# Altium footprint library PCBLIB.PcbLib: 775 footprints (part 42 of 49)
Each footprint in its own frame and in the unit in brackets; x right, y up, seen from the top. Pads: shape width x height; smd on the part's side, far side on the other; paste and mask are expansions set on the pad; w line width, h text height; cw(c..) or ccw(c..) is an arc to the next point about the centre after c.
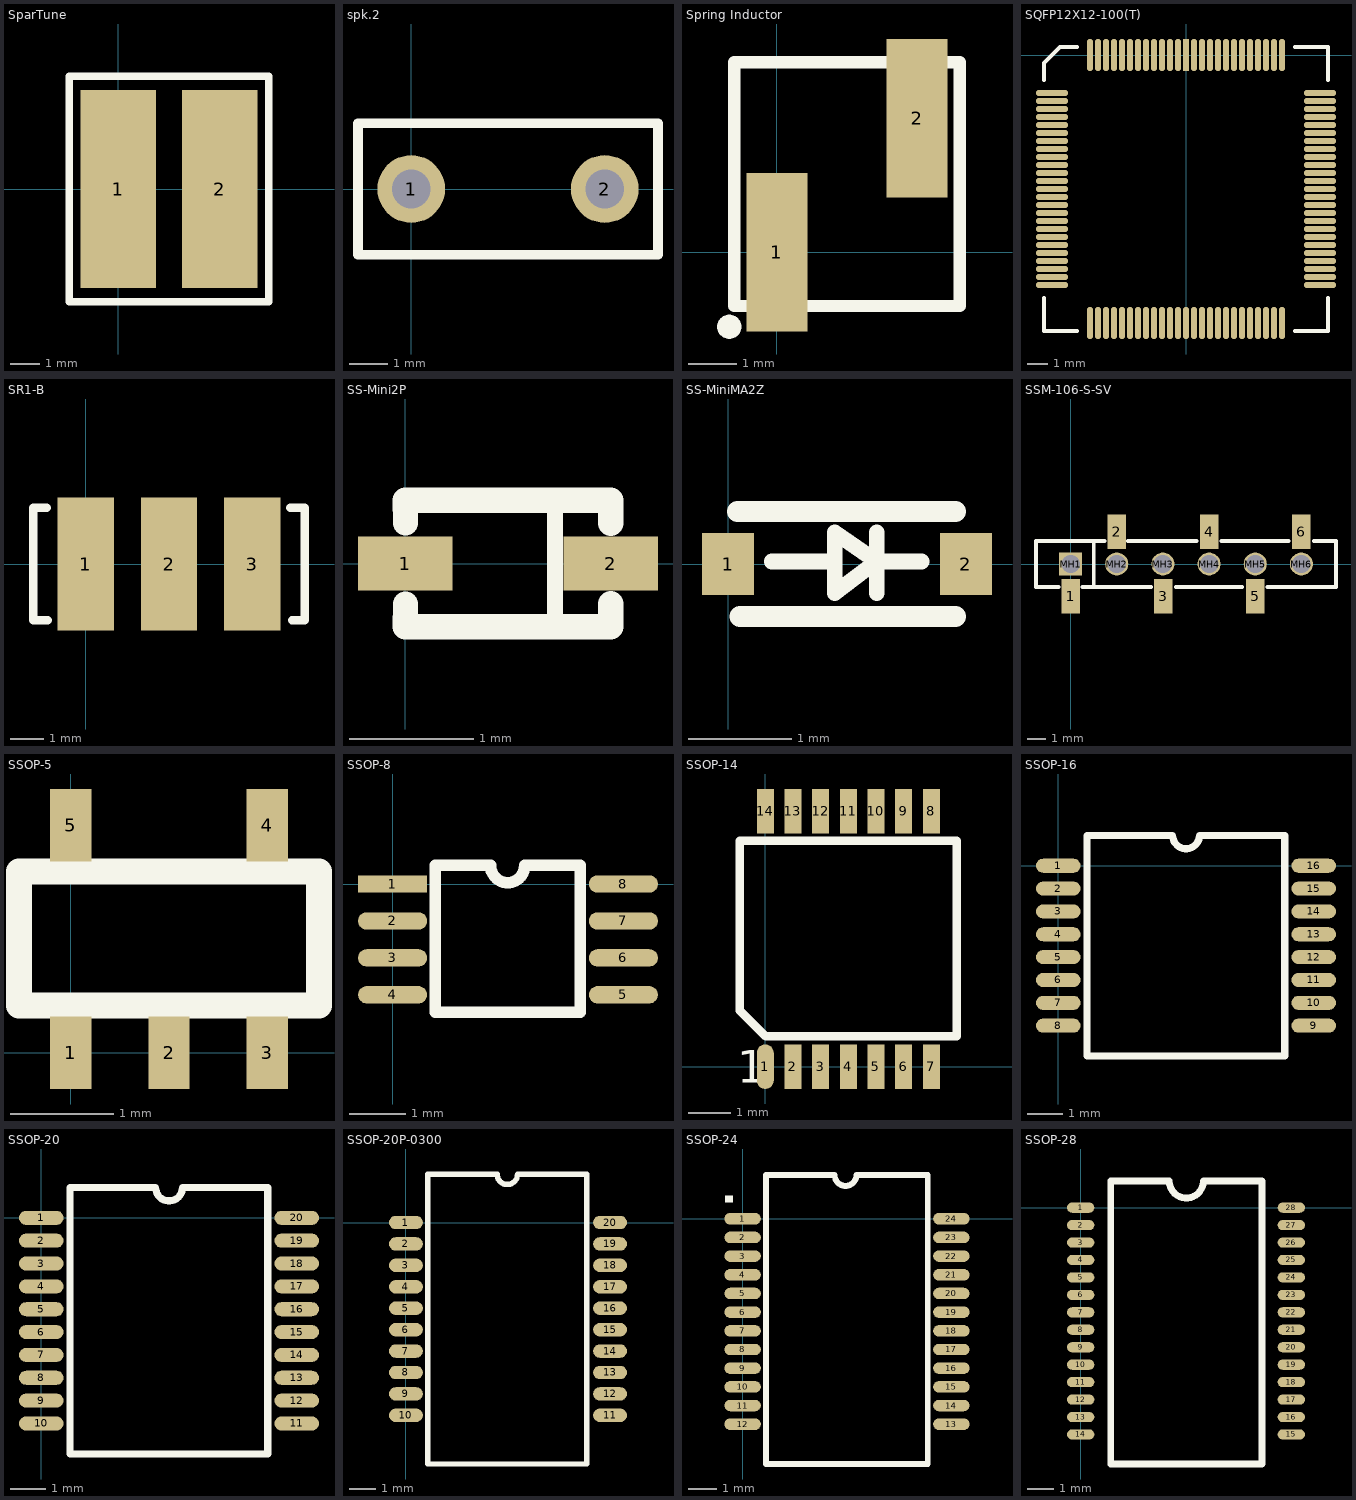
[diagram p41: the footprints below, top view; thin cyan lines are the x and y axes]

## SparTune [mil]
height 40
pads (2):
  rect 100x264 smd: 1(0,0) 2(135,0)
TopOverlay:
  lines w10: -65,-150 200,-150 200,150 -65,150 -65,-150
Mechanical4:
  text ".110" at 0,0 h1

## spk.2 [mil]
pads (2):
  round 70 hole 40: 1(0,0) 2(200,0)
TopOverlay:
  lines w10: -55,-68 -55,68 255,68 255,-68 -55,-68

## Spring Inductor [mil]
pads (3):
  rect 50x130 smd: 1(0,0) 2(115,110)
  round 20 on Top Overlay: ""(-39,-61)
TopOverlay:
  lines w10: -35,-44 150,-44 150,156 -35,156 -35,-44

## SQFP12X12-100(T) [mm]
pads (100):
  rect 0.3x1.6 smd: 1(0,0)
  oval 0.3x1.6 smd: 2(-0.4,0) 3(-0.8,0) 4(-1.2,0) 5(-1.6,0) 6(-2,0) 7(-2.4,0) 8(-2.8,0) 9(-3.2,0) 10(-3.6,0) 11(-4,0) 12(-4.4,0) 13(-4.8,0) 39(-4.8,-13.4) 40(-4.4,-13.4) 41(-4,-13.4) 42(-3.6,-13.4) 43(-3.2,-13.4) 44(-2.8,-13.4) 45(-2.4,-13.4) 46(-2,-13.4) 47(-1.6,-13.4) 48(-1.2,-13.4) 49(-0.8,-13.4) 50(-0.4,-13.4) 51(0,-13.4) 52(0.4,-13.4) 53(0.8,-13.4) 54(1.2,-13.4) 55(1.6,-13.4) 56(2,-13.4) 57(2.4,-13.4) 58(2.8,-13.4) 59(3.2,-13.4) 60(3.6,-13.4) 61(4,-13.4) 62(4.4,-13.4) 63(4.8,-13.4) 89(4.8,0) 90(4.4,0) 91(4,0) 92(3.6,0) 93(3.2,0) 94(2.8,0) 95(2.4,0) 96(2,0) 97(1.6,0) 98(1.2,0) 99(0.8,0) 100(0.4,0)
  oval 1.6x0.3 smd: 14(-6.7,-1.9) 15(-6.7,-2.3) 16(-6.7,-2.7) 17(-6.7,-3.1) 18(-6.7,-3.5) 19(-6.7,-3.9) 20(-6.7,-4.3) 21(-6.7,-4.7) 22(-6.7,-5.1) 23(-6.7,-5.5) 24(-6.7,-5.9) 25(-6.7,-6.3) 26(-6.7,-6.7) 27(-6.7,-7.1) 28(-6.7,-7.5) 29(-6.7,-7.9) 30(-6.7,-8.3) 31(-6.7,-8.7) 32(-6.7,-9.1) 33(-6.7,-9.5) 34(-6.7,-9.9) 35(-6.7,-10.3) 36(-6.7,-10.7) 37(-6.7,-11.1) 38(-6.7,-11.5) 64(6.7,-11.5) 65(6.7,-11.1) 66(6.7,-10.7) 67(6.7,-10.3) 68(6.7,-9.9) 69(6.7,-9.5) 70(6.7,-9.1) 71(6.7,-8.7) 72(6.7,-8.3) 73(6.7,-7.9) 74(6.7,-7.5) 75(6.7,-7.1) 76(6.7,-6.7) 77(6.7,-6.3) 78(6.7,-5.9) 79(6.7,-5.5) 80(6.7,-5.1) 81(6.7,-4.7) 82(6.7,-4.3) 83(6.7,-3.9) 84(6.7,-3.5) 85(6.7,-3.1) 86(6.7,-2.7) 87(6.7,-2.3) 88(6.7,-1.9)
TopOverlay:
  lines w0.2: -7.1,-12.15 -7.1,-13.8 -5.45,-13.8 ; -7.1,-1.25 -7.1,-0.4 -6.3,0.4 -5.45,0.4 ; 5.45,-13.8 7.1,-13.8 7.1,-12.15 ; 5.45,0.4 7.1,0.4 7.1,-1.25

## SR1-B [mil]
pads (3):
  rect 67x158 smd: 1(0,0) 2(99,0) 3(198,0)
TopOverlay:
  lines w10: -46,67 -62,67 -62,-67 -45,-67 ; 243,67 260,67 260,-67 245,-67

## SS-Mini2P [mil]
pads (2):
  rect 30x17 smd: 1(0,0) 2(65,0)
TopOverlay:
  lines w5: 47.4,-20.32 47.4,19.68
  lines w8: 0.01,-12.79 0,-20 65,-20 65,-12.76 ; 0.01,12.86 0,20 65,20 65,12.76
Mechanical4:
  text ".040" at 65,0 h1
  text ".025" at 0,0 h1

## SS-MiniMA2Z [mm]
height 1.524
pads (2):
  rect 0.5x0.6 smd: 1(0,0) 2(2.3,0)
TopOverlay:
  lines w0.152: 0.422,0.025 1.032,0.025 ; 1.438,-0.279 1.438,0.025 ; 1.438,0.305 1.438,0.025 ; 1.87,0.025 1.438,0.025 ; 1.032,0.025 1.032,-0.279 1.438,0.025 ; 1.032,0.025 1.032,0.305 1.438,0.025
  lines w0.203: 0.092,0.508 2.2,0.508 ; 0.117,-0.508 2.2,-0.508
Mechanical4:
  text ".025" at 0.549,0 h0.03
  text ".040" at 2.2,0 h0.03

## SSM-106-S-SV [mil]
height 390
pads (12):
  rect 40x75 smd: 1(0,-70) 2(100,70) 3(201,-70) 4(300,70) 5(400,-70) 6(500,70)
  rect 50x50 hole 40: MH1(0,0)
  round 50 hole 40: MH2(100,0) MH3(200,0) MH4(300,0) MH5(400,0) MH6(500,0)
TopOverlay:
  lines w8: -26,-50 -75,-50 -75,50 50,50 ; 25,-50 50,-50 ; 74,50 50,50 ; 124,50 273,50 ; 175,-50 50,-50 ; 228,-50 372,-50 ; 327,50 472,50 ; 426,-50 575,-50 575,50 527,50 ; 50,-50 50,50
Mechanical4:
  text ".358" at 0,0 h1

## SSOP-5 [mm]
pads (5):
  rect 0.4x0.7 smd: 1(0,0) 2(0.95,0) 3(1.9,0) 4(1.9,2.2) 5(0,2.2)
TopOverlay:
  lines w0.254: -0.5,0.457 -0.5,1.753 2.4,1.753 2.4,0.457 -0.5,0.457

## SSOP-8 [mil]
height 45
pads (8):
  rect 48x12 smd: 1(0,0)
  oval 48x12 smd: 2(0,-25.6) 3(0,-51.2) 4(0,-76.8) 5(160,-76.8) 6(160,-51.2) 7(160,-25.6) 8(160,0)
TopOverlay:
  lines w8: 29.61,12.74 29.61,-89 130,-89 130,12.74 ; 29.61,13 67.93,13 ; 67.93,12.74 ccw(c79.74,12.74) 91.55,12.74 ; 91.55,13 130,13
Mechanical4:
  text "0" at 0,0 h1

## SSOP-14 [mm]
height 1.2
pads (14):
  oval 0.4x1.05 smd: 1(0,0)
  rect 0.4x1.05 smd: 2(0.65,0) 3(1.3,0) 4(1.95,0) 5(2.6,0) 6(3.25,0) 7(3.9,0) 8(3.9,6) 9(3.25,6) 10(2.6,6) 11(1.95,6) 12(1.3,6) 13(0.65,6) 14(0,6)
TopOverlay:
  lines w0.203: -0.6,1.321 -0.6,5.309 4.5,5.309 4.5,0.711 0.01,0.711 -0.6,1.321
  text "1" at -0.66,-0.381 h0.76

## SSOP-16 [mm]
height 2.032
pads (16):
  oval 1.27x0.4 smd: 1(0,0) 2(0,-0.65) 3(0,-1.3) 4(0,-1.95) 5(0,-2.6) 6(0,-3.25) 7(0,-3.9) 8(0,-4.55) 9(7.264,-4.55) 10(7.264,-3.9) 11(7.264,-3.25) 12(7.264,-2.6) 13(7.264,-1.95) 14(7.264,-1.3) 15(7.264,-0.65) 16(7.264,0)
TopOverlay:
  lines w0.203: 0.813,-5.414 0.813,0.864 3.252,0.864 ccw(c3.633,0.864) 4.014,0.864 6.443,0.864 6.443,-5.414 0.813,-5.414

## SSOP-20 [mm]
pads (20):
  oval 1.27x0.4 smd: 1(0,0) 2(0,-0.65) 3(0,-1.3) 4(0,-1.95) 5(0,-2.6) 6(0,-3.25) 7(0,-3.9) 8(0,-4.55) 9(0,-5.2) 10(0,-5.85) 11(7.264,-5.85) 12(7.264,-5.2) 13(7.264,-4.55) 14(7.264,-3.9) 15(7.264,-3.25) 16(7.264,-2.6) 17(7.264,-1.95) 18(7.264,-1.3) 19(7.264,-0.65) 20(7.264,0)
TopOverlay:
  lines w0.203: 0.813,-6.716 6.443,-6.716 6.443,0.864 4.014,0.864 cw(c3.633,0.864) 3.252,0.864 0.813,0.864 0.813,-6.716

## SSOP-20P-0300 [mm]
pads (20):
  oval 1.27x0.5 smd: 1(0,0) 2(0,-0.8) 3(0,-1.6) 4(0,-2.4) 5(0,-3.2) 6(0,-4) 7(0,-4.8) 8(0,-5.6) 9(0,-6.4) 10(0,-7.2) 11(7.62,-7.2) 12(7.62,-6.4) 13(7.62,-5.6) 14(7.62,-4.8) 15(7.62,-4) 16(7.62,-3.2) 17(7.62,-2.4) 18(7.62,-1.6) 19(7.62,-0.8) 20(7.62,0)
TopOverlay:
  lines w0.203: 0.813,1.8 0.813,-9.017 6.756,-9.017 6.756,1.8 ; 0.813,1.803 3.404,1.803 ccw(c3.785,1.803) 4.166,1.803 6.756,1.803

## SSOP-24 [mm]
pads (24):
  oval 1.27x0.4 smd: 1(0,0) 2(0,-0.65) 3(0,-1.3) 4(0,-1.95) 5(0,-2.6) 6(0,-3.25) 7(0,-3.9) 8(0,-4.55) 9(0,-5.2) 10(0,-5.85) 11(0,-6.5) 12(0,-7.15) 13(7.264,-7.15) 14(7.264,-6.5) 15(7.264,-5.85) 16(7.264,-5.2) 17(7.264,-4.55) 18(7.264,-3.9) 19(7.264,-3.25) 20(7.264,-2.6) 21(7.264,-1.95) 22(7.264,-1.3) 23(7.264,-0.65) 24(7.264,0)
TopOverlay:
  rectangle: -0.61,0.559 -0.33,0.813
  lines w0.203: 0.813,-8.534 0.813,1.524 2.591,1.524 3.2,1.524 ccw(c3.581,1.524) 3.962,1.524 4.674,1.524 6.443,1.524 6.443,-8.534 0.813,-8.534

## SSOP-28 [mil]
pads (28):
  oval 40x15 smd: 1(0,0) 2(0,-25.59) 3(0,-51.18) 4(0,-76.77) 5(0,-102.36) 6(0,-127.95) 7(0,-153.54) 8(0,-179.13) 9(0,-204.72) 10(0,-230.31) 11(0,-255.91) 12(0,-281.5) 13(0,-307.09) 14(0,-332.68) 15(309,-332.68) 16(309,-307.09) 17(309,-281.5) 18(309,-255.91) 19(309,-230.31) 20(309,-204.72) 21(309,-179.13) 22(309,-153.54) 23(309,-127.95) 24(309,-102.36) 25(309,-76.77) 26(309,-51.18) 27(309,-25.59) 28(309,0)
TopOverlay:
  lines w10: 44,-376 266,-376 266,39 180,39 cw(c155,39) 130,39 44,39 44,-376